# Altium schematic symbol library LATTICEPLDS_Library.SchLib: 291 symbols (part 17 of 32) (continued)
## LFE5G-45F-BG381 (continued)
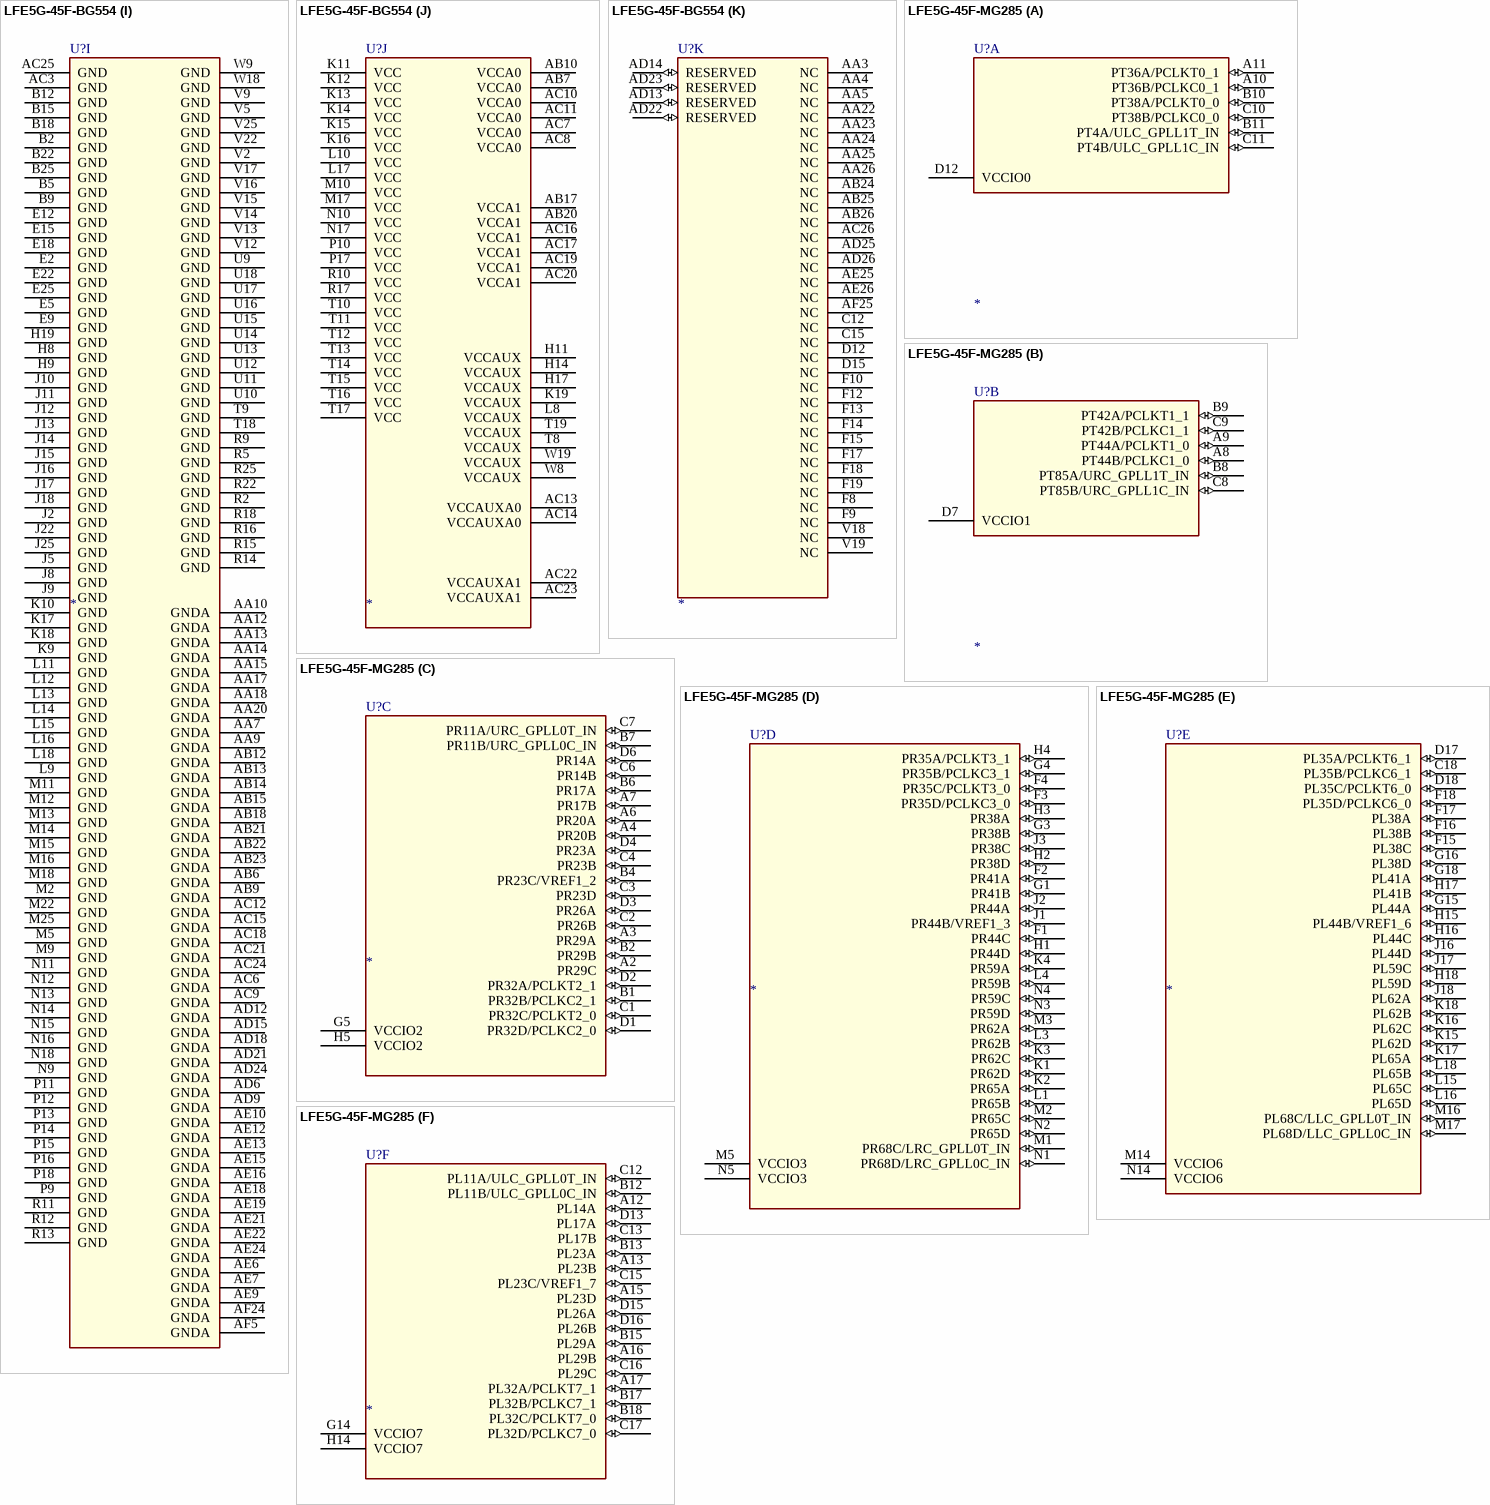
[diagram p162: symbols LFE5G-45F-BG554 to LFE5G-45F-MG285]

## LFE5G-45F-BG554
designator U?
SWAP_INFO: (S1+S2+S3+S4+S5+S6+S7+S8+S9+S10+S11); SPLIT_INST: TRUE
part A pins: A2 PT4A/ ULC_GPLL1T_IN (io), A3 PT4B/ ULC_GPLL1C_IN (io), A4 PT6B (io), A5 PT15A (io), A6 PT15B (io), A8 PT18A (io), A9 PT18B (io), A10 PT31A (io), A11 PT31B (io), A12 PT38A/ PCLKT0_0 (io), A13 PT38B/ PCLKC0_0 (io), B4 PT6A (io), B6 PT13B (io), B8 PT20A (io), B10 PT29B (io), B11 PT33B/ GR_PCLK0_0 (io), C5 PT9B (io), C6 PT13A (io), C8 PT20B (io), C9 PT24B (io), C10 PT29A (io), C11 PT33A/ GR_PCLK0_1 (io), D5 PT9A (io), D6 PT11B (io), D8 PT22B (io), D9 PT24A (io), D10 PT27B (io), D11 PT36B/ PCLKC0_1 (io), E6 PT11A (io), E8 PT22A (io), E10 PT27A (io), E11 PT36A/ PCLKT0_1 (io), H10 VCCIO0 (power), H12 VCCIO0 (power), H13 VCCIO0 (power)
part B pins: A14 PT51A (io), A15 PT51B (io), A16 PT58A (io), A17 PT58B (io), A18 PT71A (io), A19 PT71B (io), A21 PT74A (io), A22 PT74B (io), A23 PT83A (io), A24 PT85A/ URC_GPLL1T_IN (io), A25 PT85B/ URC_GPLL1C_IN (io), B13 PT49A (io), B14 PT49B (io), B16 PT56A (io), B17 PT60A (io), B19 PT69B (io), B21 PT76A (io), B23 PT83B (io), C13 PT47A/ GR_PCLK1_0 (io), C14 PT47B/ GR_PCLK1_1 (io), C16 PT56B (io), C17 PT60B (io), C18 PT65A (io), C19 PT69A (io), C21 PT76B (io), C22 PT80A (io), D13 PT44A/ PCLKT1_0 (io), D14 PT44B/ PCLKC1_0 (io), D16 PT53A (io), D17 PT62A (io), D18 PT65B (io), D19 PT67B (io), D21 PT78A (io), D22 PT80B (io), E13 PT42A/ PCLKT1_1 (io), E14 PT42B/ PCLKC1_1 (io), E16 PT53B (io), E17 PT62B (io), E19 PT67A (io), E21 PT78B (io), H15 VCCIO1 (power), H16 VCCIO1 (power), H18 VCCIO1 (power)
part C pins: B24 PR14D (io), B26 PR14C (io), C23 PR11C (io), C24 PR11D (io), C25 PR11A/ URC_GPLL0T_IN (io), C26 PR11B/ URC_GPLL0C_IN/S0_IN (io), D23 PR14A (io), D24 PR14B (io), D25 PR17A (io), D26 PR17D (io), E23 PR20C (io), E24 PR17C (io), E26 PR17B (io), F22 PR23A (io), F23 PR23B (io), F24 PR20D (io), F25 PR20A (io), F26 PR20B (io), H21 PR23D (io), H22 PR23C/ VREF1_2 (io), H23 PR26C (io), J19 VCCIO2 (power), J21 PR26A (io), J23 PR29B (io), K21 PR26B (io), K22 PR29A/ GR_PCLK2_1 (io), K23 PR32A/ PCLKT2_1 (io), L19 VCCIO2 (power), L22 PR26D (io), L23 PR32B/ PCLKC2_1 (io), M19 VCCIO2 (power), M21 PR29C/ GR_PCLK2_0 (io), M23 PR29D (io), N19 VCCIO2 (power), N21 PR32C/ PCLKT2_0 (io), N22 PR32D/ PCLKC2_0 (io)
part D pins: H24 PR35A/ PCLKT3_1 (io), H25 PR35C/ PCLKT3_0 (io), H26 PR35D/ PCLKC3_0 (io), J24 PR35B/ PCLKC3_1 (io), J26 PR38B (io), K24 PR38C/ GR_PCLK3_1 (io), K25 PR38A/ GR_PCLK3_0 (io), K26 PR41C (io), L24 PR38D (io), L25 PR41A (io), L26 PR41D (io), M24 PR44D (io), M26 PR41B (io), N23 PR47D (io), N24 PR44C (io), N25 PR44B/ VREF1_3 (io), N26 PR44A (io), P19 VCCIO3 (power), P21 PR47C (io), P22 PR47B (io), P23 PR47A (io), P24 PR59D (io), P25 PR62A (io), P26 PR62B (io), R19 VCCIO3 (power), R21 PR50C (io), R23 PR50A (io), R24 PR59C (io), R26 PR62D (io), T22 PR50B (io), T23 PR50D (io), T24 PR59A (io), T25 PR62C (io), T26 PR65D (io), U19 VCCIO3 (power), U21 PR53C (io), U22 PR53B (io), U23 PR53D (io), U24 PR59B (io), U25 PR65B (io), U26 PR65C (io), V21 PR56B (io), V23 PR53A (io), V24 PR68A (io), V26 PR65A (io), W21 PR56D (io), W22 PR56C (io), W23 PR56A (io), W24 PR68D/ LRC_GPLL0C_IN (io), W25 PR68C/ LRC_GPLL0T_IN (io), W26 PR68B (io)
part E pins: H1 PL35D/ PCLKC6_0 (io), H2 PL35C/ PCLKT6_0 (io), H3 PL35A/ PCLKT6_1 (io), J1 PL38B (io), J3 PL35B/ PCLKC6_1 (io), K1 PL41C (io), K2 PL38A/ GR_PCLK6_0 (io), K3 PL38C/ GR_PCLK6_1 (io), L1 PL41D (io), L2 PL41A (io), L3 PL38D (io), M1 PL41B (io), M3 PL44D (io), N1 PL44A (io), N2 PL44B/ VREF1_6 (io), N3 PL44C (io), N4 PL47D (io), P1 PL62B (io), P2 PL62A (io), P3 PL59D (io), P4 PL47A (io), P5 PL47B (io), P6 PL47C (io), P8 VCCIO6 (power), R1 PL62D (io), R3 PL59C (io), R4 PL50A (io), R6 PL50C (io), R8 VCCIO6 (power), T1 PL65D (io), T2 PL62C (io), T3 PL59A (io), T4 PL50D (io), T5 PL50B (io), U1 PL65C (io), U2 PL65B (io), U3 PL59B (io), U4 PL53D (io), U5 PL53B (io), U6 PL53C (io), U8 VCCIO6 (power), V1 PL65A (io), V3 PL68A (io), V4 PL53A (io), V6 PL56B (io), V8 VCCIO6 (power), W1 PL68B (io), W2 PL68C/ LLC_GPLL0T_IN (io), W3 PL68D/ LLC_GPLL0C_IN (io), W4 PL56A (io), W5 PL56C (io), W6 PL56D (io)
part F pins: B1 PL14C (io), B3 PL14D (io), C1 PL11B/ ULC_GPLL0C_IN (io), C2 PL11A/ ULC_GPLL0T_IN (io), C3 PL11D (io), C4 PL11C (io), D1 PL17D (io), D2 PL17A (io), D3 PL14B (io), D4 PL14A (io), E1 PL17B (io), E3 PL17C (io), E4 PL20C (io), F1 PL20B (io), F2 PL20A (io), F3 PL20D (io), F4 PL23B (io), F5 PL23A (io), H4 PL26C (io), H5 PL23C/ VREF1_7 (io), H6 PL23D (io), J4 PL29B (io), J6 PL26A (io), K4 PL32A/ PCLKT7_1 (io), K5 PL29A/ GR_PCLK7_1 (io), K6 PL26B (io), K8 VCCIO7 (power), L4 PL32B/ PCLKC7_1 (io), L5 PL26D (io), M4 PL29D (io), M6 PL29C/ GR_PCLK7_0 (io), M8 VCCIO7 (power), N5 PL32D/ PCLKC7_0 (io), N6 PL32C/ PCLKT7_0 (io), N8 VCCIO7 (power)
part G pins: AA1 PB4A/ D7/IO7 (io), AA2 PB15A/ HOLDN/DI/BUSY/CSSPIN/CEN (io), AB1 PB4B/ D6/IO6 (io), AB2 PB13A/ SN/CSN (io), AB3 PB15B/ DOUT/CSON (io), AB4 PROGRAMN (io), AB5 TDO (io), AC1 PB6A/ D5/MISO2/IO5 (io), AC2 PB13B/ CS1N (io), AC4 DONE (io), AC5 TDI (io), AD1 PB6B/ D4/MOSI2/IO4 (io), AD2 PB11A/ D1/MISO/IO1 (io), AD3 PB18A/ WRITEN (io), AD4 CFG_2 (io), AD5 TCK (io), AE1 PB9A/ D3/IO3 (io), AE2 PB11B/ D0/MOSI/IO0 (io), AE3 CCLK/ MCLK/SCK (io), AE4 CFG_1 (io), AE5 TMS (io), AF2 PB9B/ D2/IO2 (io), AF3 INITN (io), AF4 CFG_0 (io), V10 VCCIO8 (power), V11 VCCIO8 (power)
part H pins: AD7 HDTXP0_D0CH0 (out), AD8 HDTXN0_D0CH0 (out), AD10 HDTXP0_D0CH1 (out), AD11 HDTXN0_D0CH1 (out), AD16 HDTXP0_D1CH0 (out), AD17 HDTXN0_D1CH0 (out), AD19 HDTXP0_D1CH1 (out), AD20 HDTXN0_D1CH1 (out), AF6 HDRXP0_D0CH0 (in), AF7 HDRXN0_D0CH0 (in), AF9 HDRXP0_D0CH1 (in), AF10 HDRXN0_D0CH1 (in), AF12 REFCLKP_D0 (in), AF13 REFCLKN_D0 (in), AF15 HDRXP0_D1CH0 (in), AF16 HDRXN0_D1CH0 (in), AF18 HDRXP0_D1CH1 (in), AF19 HDRXN0_D1CH1 (in), AF21 REFCLKP_D1 (in), AF22 REFCLKN_D1 (in), W10 VCCHTX0_D0CH0 (power), W11 VCCHRX0_D0CH0 (power), W12 VCCHRX1_D0CH1 (power), W13 VCCHTX1_D0CH1 (power), W14 VCCHTX0_D1CH0 (power), W15 VCCHRX0_D1CH0 (power), W16 VCCHRX1_D1CH1 (power), W17 VCCHTX1_D1CH1 (power)
part I pins: AA7 GNDA (power), AA9 GNDA (power), AA10 GNDA (power), AA12 GNDA (power), AA13 GNDA (power), AA14 GNDA (power), AA15 GNDA (power), AA17 GNDA (power), AA18 GNDA (power), AA20 GNDA (power), AB6 GNDA (power), AB9 GNDA (power), AB12 GNDA (power), AB13 GNDA (power), AB14 GNDA (power), AB15 GNDA (power), AB18 GNDA (power), AB21 GNDA (power), AB22 GNDA (power), AB23 GNDA (power), AC3 GND (power), AC6 GNDA (power), AC9 GNDA (power), AC12 GNDA (power), AC15 GNDA (power), AC18 GNDA (power), AC21 GNDA (power), AC24 GNDA (power), AC25 GND (power), AD6 GNDA (power), AD9 GNDA (power), AD12 GNDA (power), AD15 GNDA (power), AD18 GNDA (power), AD21 GNDA (power), AD24 GNDA (power), AE6 GNDA (power), AE7 GNDA (power), AE9 GNDA (power), AE10 GNDA (power), AE12 GNDA (power), AE13 GNDA (power), AE15 GNDA (power), AE16 GNDA (power), AE18 GNDA (power), AE19 GNDA (power), AE21 GNDA (power), AE22 GNDA (power), AE24 GNDA (power), AF5 GNDA (power), AF24 GNDA (power), B2 GND (power), B5 GND (power), B9 GND (power), B12 GND (power), B15 GND (power), B18 GND (power), B22 GND (power), B25 GND (power), E2 GND (power), E5 GND (power), E9 GND (power), E12 GND (power), E15 GND (power), E18 GND (power), E22 GND (power), E25 GND (power), H8 GND (power), H9 GND (power), H19 GND (power), J2 GND (power), J5 GND (power), J8 GND (power), J9 GND (power), J10 GND (power), J11 GND (power), J12 GND (power), J13 GND (power), J14 GND (power), J15 GND (power), J16 GND (power), J17 GND (power), J18 GND (power), J22 GND (power), J25 GND (power), K9 GND (power), K10 GND (power), K17 GND (power), K18 GND (power), L9 GND (power), L11 GND (power), L12 GND (power), L13 GND (power), L14 GND (power), L15 GND (power), L16 GND (power), L18 GND (power), M2 GND (power), M5 GND (power), M9 GND (power), M11 GND (power), M12 GND (power), M13 GND (power), M14 GND (power), M15 GND (power), M16 GND (power), M18 GND (power), M22 GND (power), M25 GND (power), N9 GND (power), N11 GND (power), N12 GND (power), N13 GND (power), N14 GND (power), N15 GND (power), N16 GND (power), N18 GND (power), P9 GND (power), P11 GND (power), P12 GND (power), P13 GND (power), P14 GND (power), P15 GND (power), P16 GND (power), P18 GND (power), R2 GND (power), R5 GND (power), R9 GND (power), R11 GND (power), R12 GND (power), R13 GND (power), R14 GND (power), R15 GND (power), R16 GND (power), R18 GND (power), R22 GND (power), R25 GND (power), T9 GND (power), T18 GND (power), U9 GND (power), U10 GND (power), U11 GND (power), U12 GND (power), U13 GND (power), U14 GND (power), U15 GND (power), U16 GND (power), U17 GND (power), U18 GND (power), V2 GND (power), V5 GND (power), V9 GND (power), V12 GND (power), V13 GND (power), V14 GND (power), V15 GND (power), V16 GND (power), V17 GND (power), V22 GND (power), V25 GND (power), W9 GND (power), W18 GND (power)
part J pins: AB7 VCCA0 (power), AB10 VCCA0 (power), AB17 VCCA1 (power), AB20 VCCA1 (power), AC7 VCCA0 (power), AC8 VCCA0 (power), AC10 VCCA0 (power), AC11 VCCA0 (power), AC13 VCCAUXA0 (power), AC14 VCCAUXA0 (power), AC16 VCCA1 (power), AC17 VCCA1 (power), AC19 VCCA1 (power), AC20 VCCA1 (power), AC22 VCCAUXA1 (power), AC23 VCCAUXA1 (power), H11 VCCAUX (power), H14 VCCAUX (power), H17 VCCAUX (power), K11 VCC (power), K12 VCC (power), K13 VCC (power), K14 VCC (power), K15 VCC (power), K16 VCC (power), K19 VCCAUX (power), L8 VCCAUX (power), L10 VCC (power), L17 VCC (power), M10 VCC (power), M17 VCC (power), N10 VCC (power), N17 VCC (power), P10 VCC (power), P17 VCC (power), R10 VCC (power), R17 VCC (power), T8 VCCAUX (power), T10 VCC (power), T11 VCC (power), T12 VCC (power), T13 VCC (power), T14 VCC (power), T15 VCC (power), T16 VCC (power), T17 VCC (power), T19 VCCAUX (power), W8 VCCAUX (power), W19 VCCAUX (power)
part K pins: AA3 NC (power), AA4 NC (power), AA5 NC (power), AA22 NC (power), AA23 NC (power), AA24 NC (power), AA25 NC (power), AA26 NC (power), AB24 NC (power), AB25 NC (power), AB26 NC (power), AC26 NC (power), AD13 RESERVED (io), AD14 RESERVED (io), AD22 RESERVED (io), AD23 RESERVED (io), AD25 NC (power), AD26 NC (power), AE25 NC (power), AE26 NC (power), AF25 NC (power), C12 NC (power), C15 NC (power), D12 NC (power), D15 NC (power), F8 NC (power), F9 NC (power), F10 NC (power), F12 NC (power), F13 NC (power), F14 NC (power), F15 NC (power), F17 NC (power), F18 NC (power), F19 NC (power), V18 NC (power), V19 NC (power)

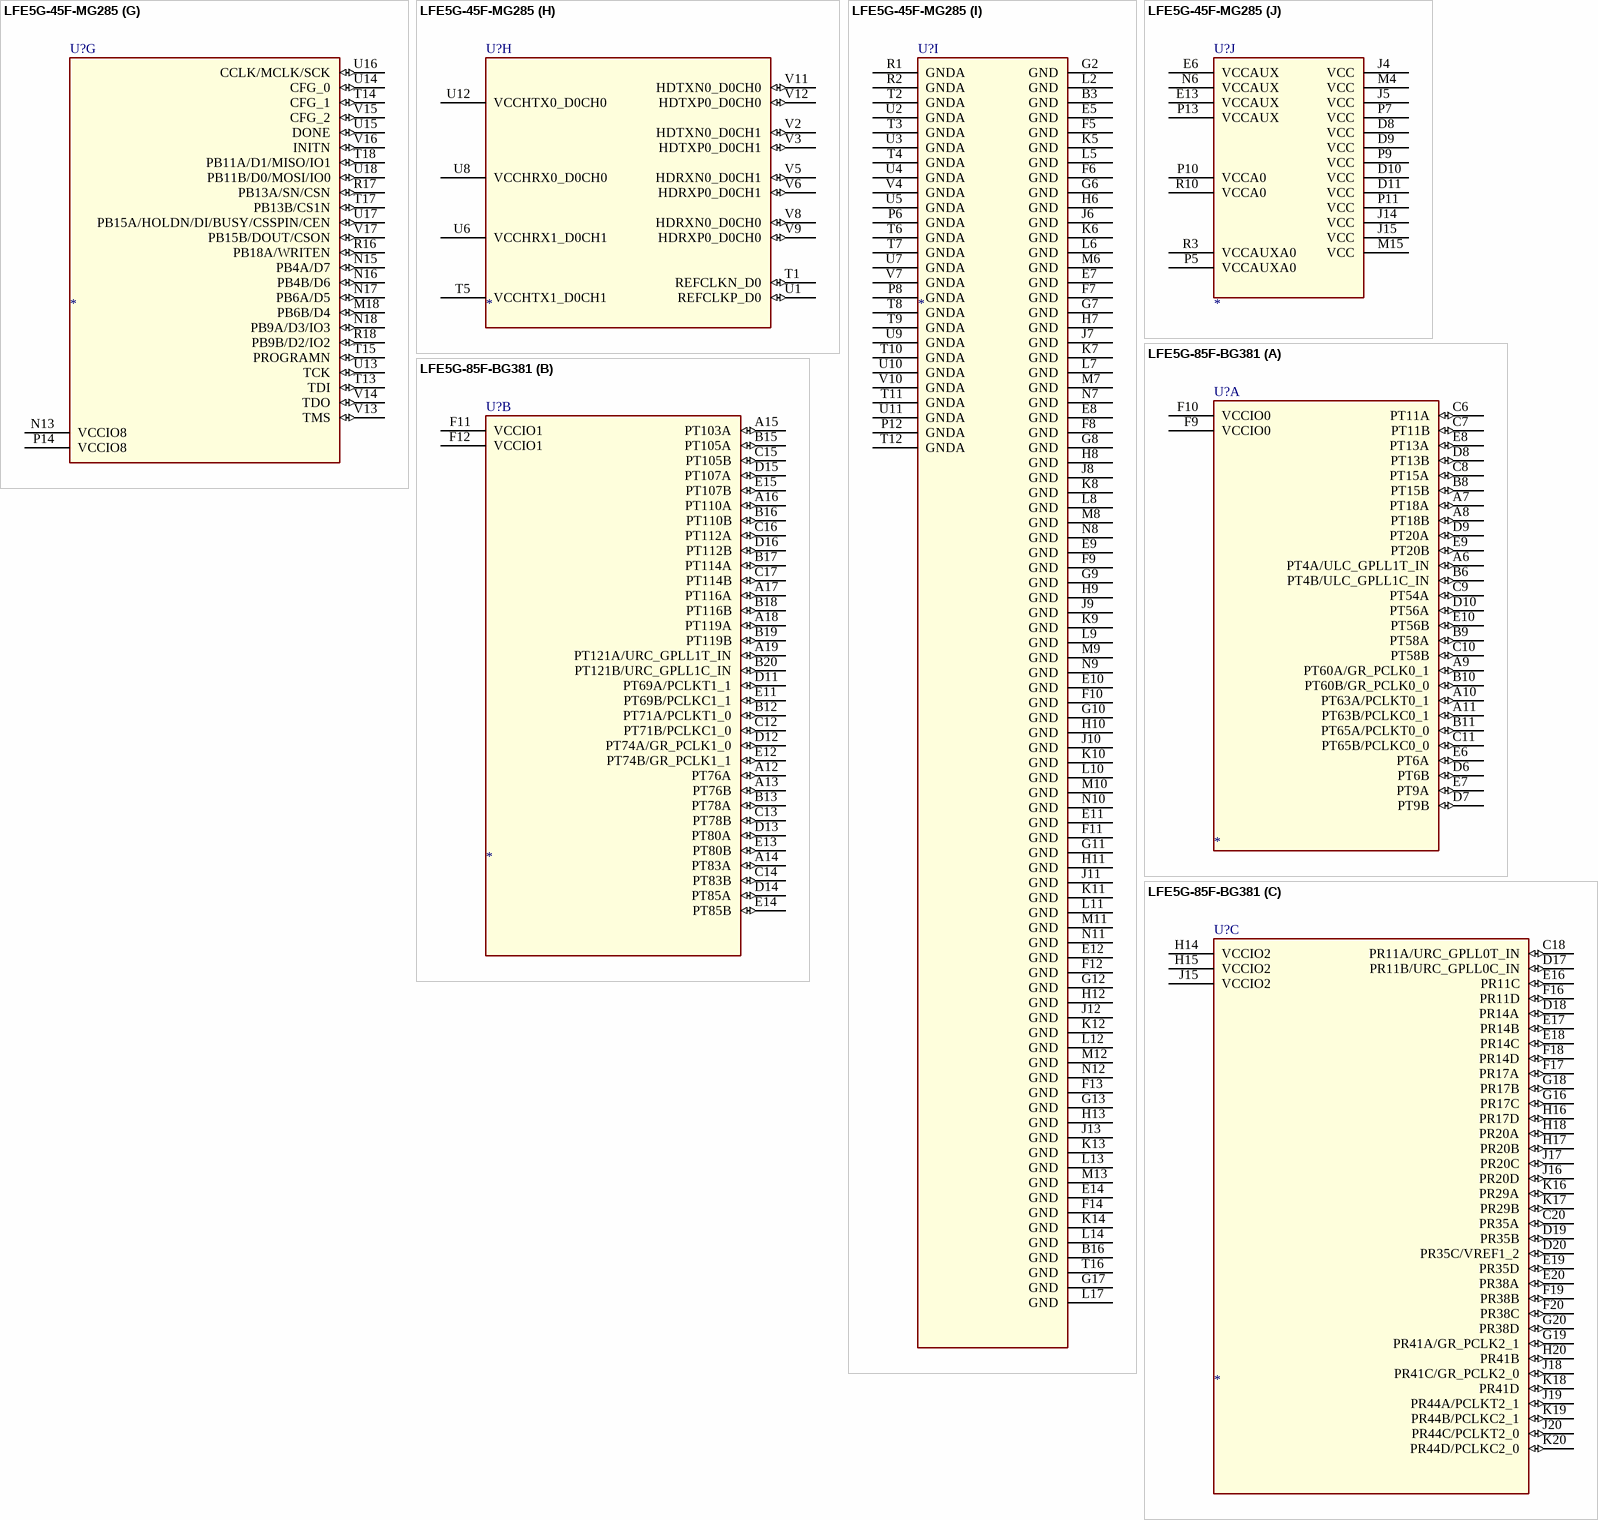
[diagram p163: symbols LFE5G-45F-MG285 to LFE5G-85F-BG381]

## LFE5G-45F-MG285
designator U?
SWAP_INFO: (S1+S2+S3+S4+S5+S6+S7+S8+S9+S10); SPLIT_INST: TRUE
part A pins: A10 PT36B/PCLKC0_1 (io), A11 PT36A/PCLKT0_1 (io), B10 PT38A/PCLKT0_0 (io), B11 PT4A/ULC_GPLL1T_IN (io), C10 PT38B/PCLKC0_0 (io), C11 PT4B/ULC_GPLL1C_IN (io), D12 VCCIO0 (power)
part B pins: A8 PT44B/PCLKC1_0 (io), A9 PT44A/PCLKT1_0 (io), B8 PT85A/URC_GPLL1T_IN (io), B9 PT42A/PCLKT1_1 (io), C8 PT85B/URC_GPLL1C_IN (io), C9 PT42B/PCLKC1_1 (io), D7 VCCIO1 (power)
part C pins: A2 PR29C (io), A3 PR29A (io), A4 PR20B (io), A6 PR20A (io), A7 PR17B (io), B1 PR32B/PCLKC2_1 (io), B2 PR29B (io), B4 PR23C/VREF1_2 (io), B6 PR17A (io), B7 PR11B/URC_GPLL0C_IN (io), C1 PR32C/PCLKT2_0 (io), C2 PR26B (io), C3 PR23D (io), C4 PR23B (io), C6 PR14B (io), C7 PR11A/URC_GPLL0T_IN (io), D1 PR32D/PCLKC2_0 (io), D2 PR32A/PCLKT2_1 (io), D3 PR26A (io), D4 PR23A (io), D6 PR14A (io), G5 VCCIO2 (power), H5 VCCIO2 (power)
part D pins: F1 PR44C (io), F2 PR41A (io), F3 PR35D/PCLKC3_0 (io), F4 PR35C/PCLKT3_0 (io), G1 PR41B (io), G3 PR38B (io), G4 PR35B/PCLKC3_1 (io), H1 PR44D (io), H2 PR38D (io), H3 PR38A (io), H4 PR35A/PCLKT3_1 (io), J1 PR44B/VREF1_3 (io), J2 PR44A (io), J3 PR38C (io), K1 PR62D (io), K2 PR65A (io), K3 PR62C (io), K4 PR59A (io), L1 PR65B (io), L3 PR62B (io), L4 PR59B (io), M1 PR68C/LRC_GPLL0T_IN (io), M2 PR65C (io), M3 PR62A (io), M5 VCCIO3 (power), N1 PR68D/LRC_GPLL0C_IN (io), N2 PR65D (io), N3 PR59D (io), N4 PR59C (io), N5 VCCIO3 (power)
part E pins: C18 PL35B/PCLKC6_1 (io), D17 PL35A/PCLKT6_1 (io), D18 PL35C/PCLKT6_0 (io), F15 PL38C (io), F16 PL38B (io), F17 PL38A (io), F18 PL35D/PCLKC6_0 (io), G15 PL44A (io), G16 PL38D (io), G18 PL41A (io), H15 PL44B/VREF1_6 (io), H16 PL44C (io), H17 PL41B (io), H18 PL59D (io), J16 PL44D (io), J17 PL59C (io), J18 PL62A (io), K15 PL62D (io), K16 PL62C (io), K17 PL65A (io), K18 PL62B (io), L15 PL65C (io), L16 PL65D (io), L18 PL65B (io), M14 VCCIO6 (power), M16 PL68C/LLC_GPLL0T_IN (io), M17 PL68D/LLC_GPLL0C_IN (io), N14 VCCIO6 (power)
part F pins: A12 PL14A (io), A13 PL23B (io), A15 PL23D (io), A16 PL29B (io), A17 PL32A/PCLKT7_1 (io), B12 PL11B/ULC_GPLL0C_IN (io), B13 PL23A (io), B15 PL29A (io), B17 PL32B/PCLKC7_1 (io), B18 PL32C/PCLKT7_0 (io), C12 PL11A/ULC_GPLL0T_IN (io), C13 PL17B (io), C15 PL23C/VREF1_7 (io), C16 PL29C (io), C17 PL32D/PCLKC7_0 (io), D13 PL17A (io), D15 PL26A (io), D16 PL26B (io), G14 VCCIO7 (power), H14 VCCIO7 (power)
part G pins: M18 PB6B/D4 (io), N13 VCCIO8 (power), N15 PB4A/D7 (io), N16 PB4B/D6 (io), N17 PB6A/D5 (io), N18 PB9A/D3/IO3 (io), P14 VCCIO8 (power), R16 PB18A/WRITEN (io), R17 PB13A/SN/CSN (io), R18 PB9B/D2/IO2 (io), T13 TDI (io), T14 CFG_1 (io), T15 PROGRAMN (io), T17 PB13B/CS1N (io), T18 PB11A/D1/MISO/IO1 (io), U13 TCK (io), U14 CFG_0 (io), U15 DONE (io), U16 CCLK/MCLK/SCK (io), U17 PB15A/HOLDN/DI/BUSY/CSSPIN/CEN (io), U18 PB11B/D0/MOSI/IO0 (io), V13 TMS (io), V14 TDO (io), V15 CFG_2 (io), V16 INITN (io), V17 PB15B/DOUT/CSON (io)
part H pins: T1 REFCLKN_D0 (io), T5 VCCHTX1_D0CH1 (power), U1 REFCLKP_D0 (io), U6 VCCHRX1_D0CH1 (power), U8 VCCHRX0_D0CH0 (power), U12 VCCHTX0_D0CH0 (power), V2 HDTXN0_D0CH1 (io), V3 HDTXP0_D0CH1 (io), V5 HDRXN0_D0CH1 (io), V6 HDRXP0_D0CH1 (io), V8 HDRXN0_D0CH0 (io), V9 HDRXP0_D0CH0 (io), V11 HDTXN0_D0CH0 (io), V12 HDTXP0_D0CH0 (io)
part I pins: B3 GND (power), B16 GND (power), E5 GND (power), E7 GND (power), E8 GND (power), E9 GND (power), E10 GND (power), E11 GND (power), E12 GND (power), E14 GND (power), F5 GND (power), F6 GND (power), F7 GND (power), F8 GND (power), F9 GND (power), F10 GND (power), F11 GND (power), F12 GND (power), F13 GND (power), F14 GND (power), G2 GND (power), G6 GND (power), G7 GND (power), G8 GND (power), G9 GND (power), G10 GND (power), G11 GND (power), G12 GND (power), G13 GND (power), G17 GND (power), H6 GND (power), H7 GND (power), H8 GND (power), H9 GND (power), H10 GND (power), H11 GND (power), H12 GND (power), H13 GND (power), J6 GND (power), J7 GND (power), J8 GND (power), J9 GND (power), J10 GND (power), J11 GND (power), J12 GND (power), J13 GND (power), K5 GND (power), K6 GND (power), K7 GND (power), K8 GND (power), K9 GND (power), K10 GND (power), K11 GND (power), K12 GND (power), K13 GND (power), K14 GND (power), L2 GND (power), L5 GND (power), L6 GND (power), L7 GND (power), L8 GND (power), L9 GND (power), L10 GND (power), L11 GND (power), L12 GND (power), L13 GND (power), L14 GND (power), L17 GND (power), M6 GND (power), M7 GND (power), M8 GND (power), M9 GND (power), M10 GND (power), M11 GND (power), M12 GND (power), M13 GND (power), N7 GND (power), N8 GND (power), N9 GND (power), N10 GND (power), N11 GND (power), N12 GND (power), P6 GNDA (power), P8 GNDA (power), P12 GNDA (power), R1 GNDA (power), R2 GNDA (power), T2 GNDA (power), T3 GNDA (power), T4 GNDA (power), T6 GNDA (power), T7 GNDA (power), T8 GNDA (power), T9 GNDA (power), T10 GNDA (power), T11 GNDA (power), T12 GNDA (power), T16 GND (power), U2 GNDA (power), U3 GNDA (power), U4 GNDA (power), U5 GNDA (power), U7 GNDA (power), U9 GNDA (power), U10 GNDA (power), U11 GNDA (power), V4 GNDA (power), V7 GNDA (power), V10 GNDA (power)
part J pins: D8 VCC (power), D9 VCC (power), D10 VCC (power), D11 VCC (power), E6 VCCAUX (power), E13 VCCAUX (power), J4 VCC (power), J5 VCC (power), J14 VCC (power), J15 VCC (power), M4 VCC (power), M15 VCC (power), N6 VCCAUX (power), P5 VCCAUXA0 (power), P7 VCC (power), P9 VCC (power), P10 VCCA0 (power), P11 VCC (power), P13 VCCAUX (power), R3 VCCAUXA0 (power), R10 VCCA0 (power)

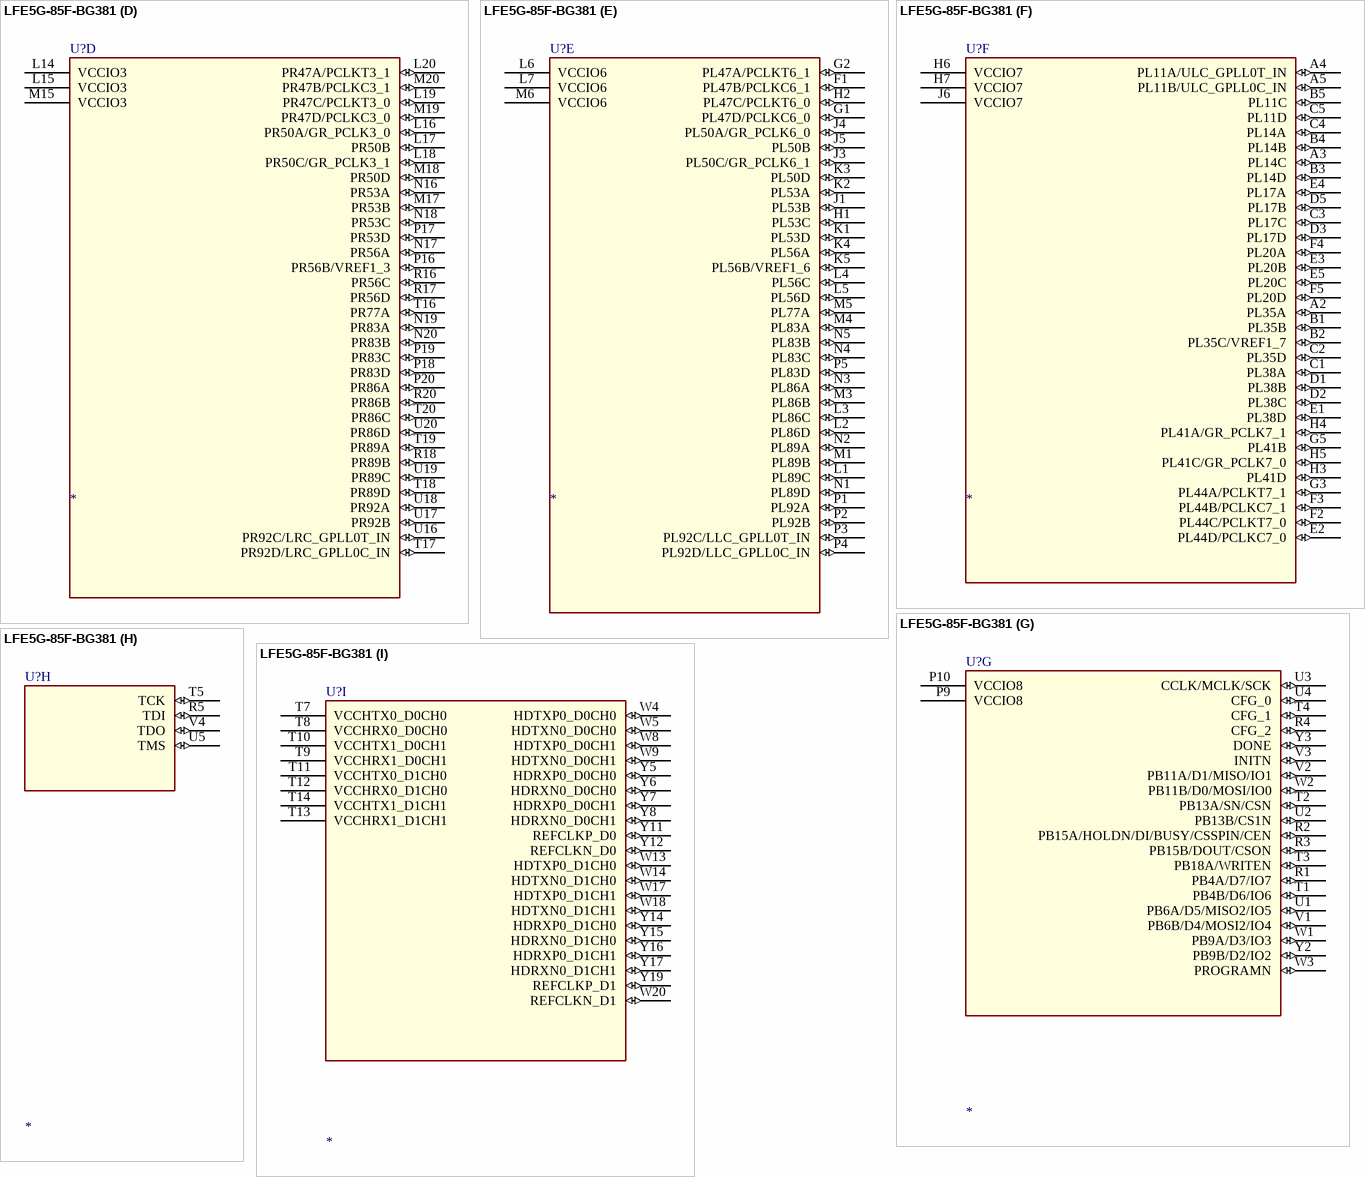
[diagram p164: symbol LFE5G-85F-BG381]

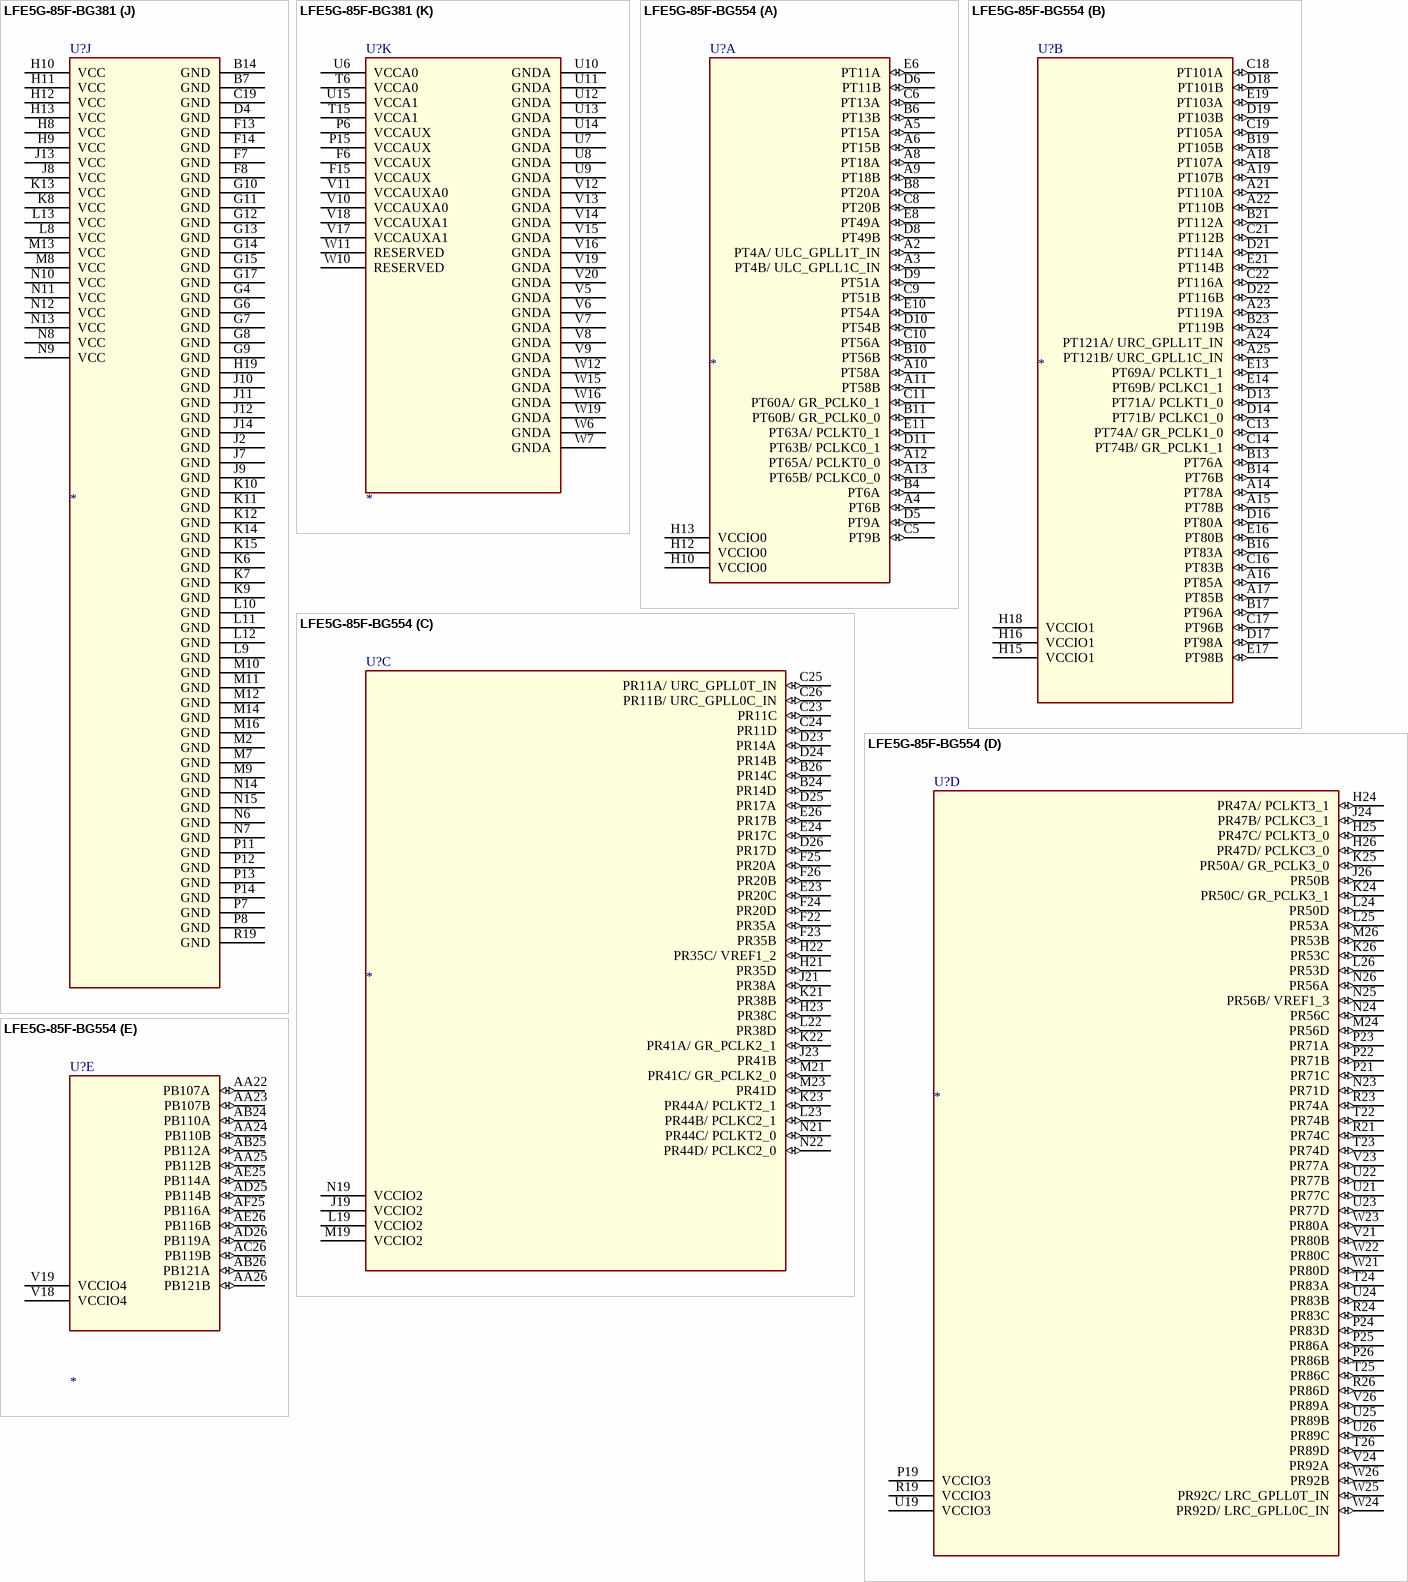
[diagram p165: symbols LFE5G-85F-BG381 to LFE5G-85F-BG554]